# Altium footprint library NDLib.PCBLIB: 499 footprints (part 30 of 32)
Each footprint in its own frame and in the unit in brackets; x right, y up, seen from the top. Pads: shape width x height; smd on the part's side, far side on the other; paste and mask are expansions set on the pad; w line width, h text height; cw(c..) or ccw(c..) is an arc to the next point about the centre after c.
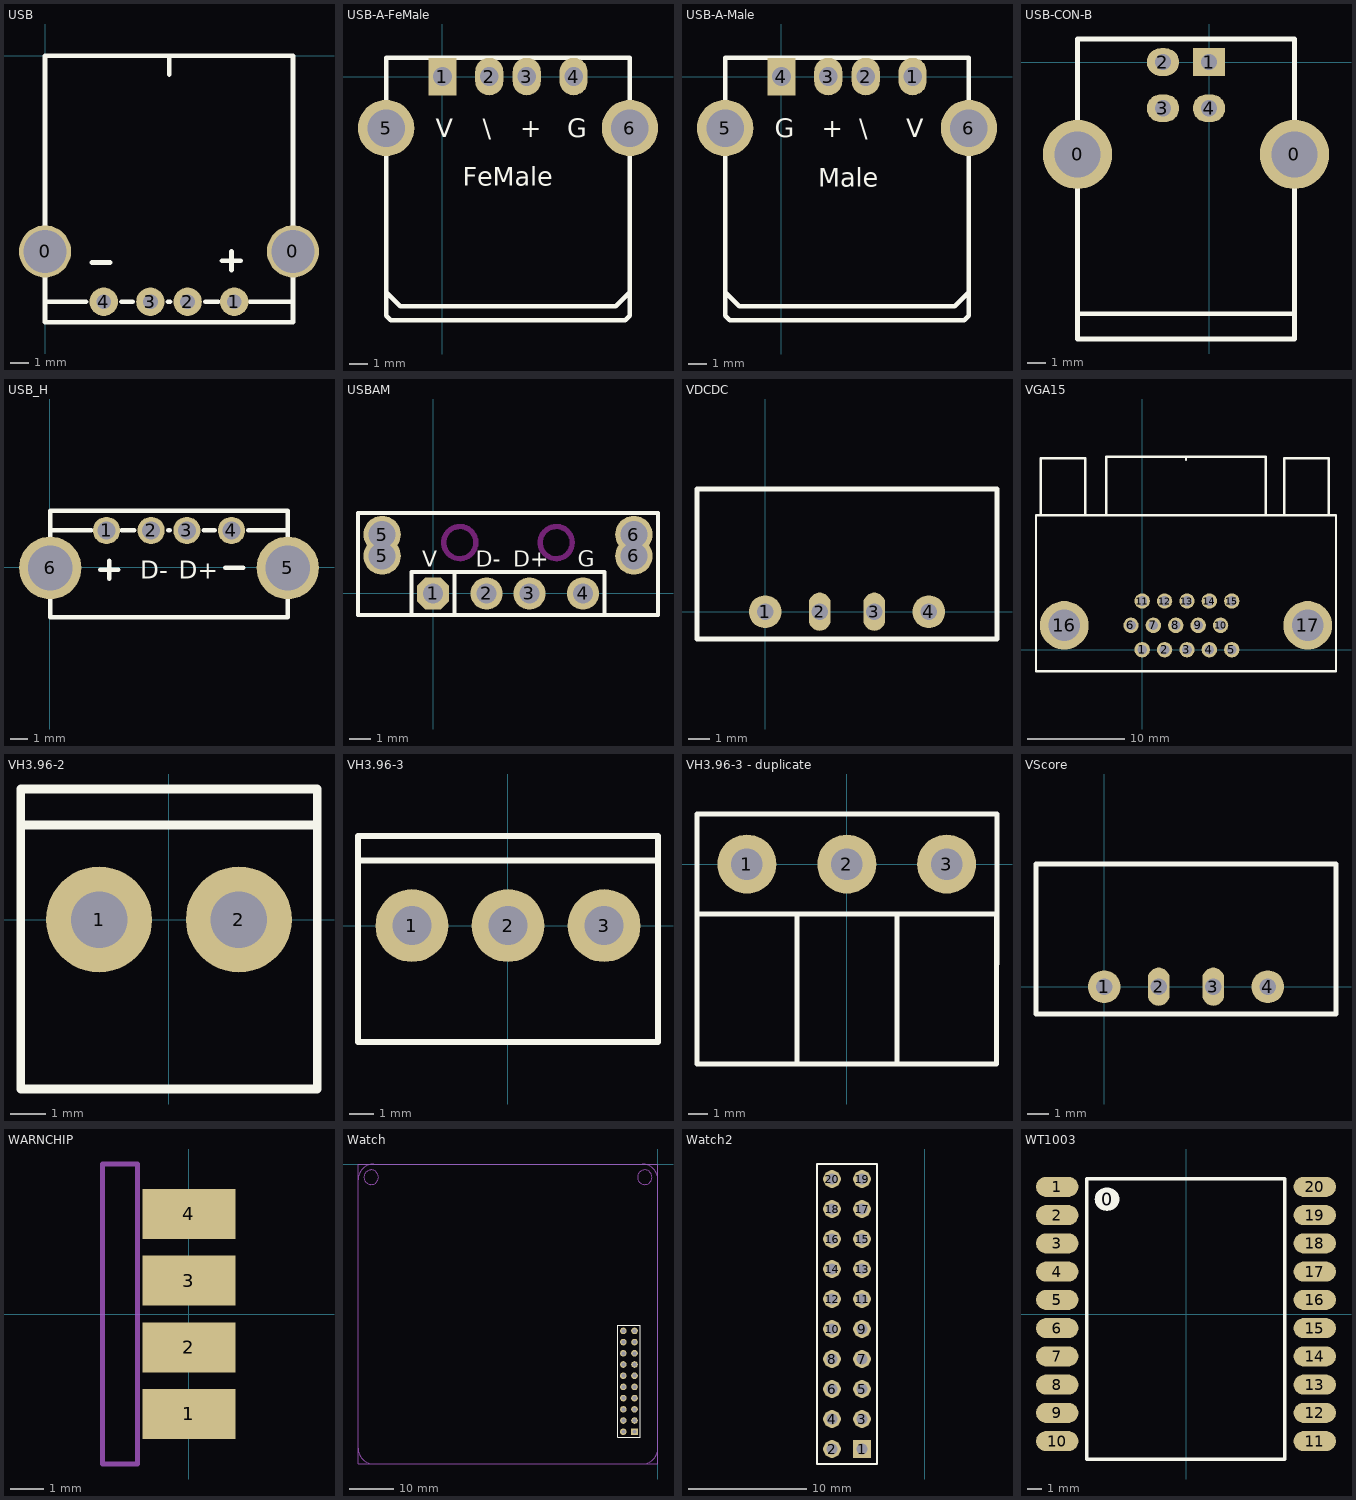
[diagram p29: the footprints below, top view; thin cyan lines are the x and y axes]

## USB [mm]
pads (6):
  round 2.8 hole 2.3: 0(0,-10.5) 0(13.3,-10.5)
  round 1.524 hole 0.8: 1(10.15,-13.2) 2(7.65,-13.2) 3(5.65,-13.2) 4(3.15,-13.2)
TopOverlay:
  lines w0.254: 0,-13.2 2.2,-13.2 ; 2.5,-11.1 3.5,-11.1 ; 4.1,-13.2 4.7,-13.2 ; 6.6,-13.2 6.7,-13.2 ; 6.66,-1 6.66,0 ; 8.6,-13.2 9.3,-13.2 ; 9.5,-11 10.5,-11 ; 10,-11.5 10,-10.5 ; 11,-13.2 13.3,-13.2 ; 0,-14.3 0,0 13.3,0 13.3,-14.3 0,-14.3
3D body: height 7.55, standoff -3.3, extent -1.245,-14.3 14.555,-0.14

## USB-A-FeMale [mil]
height 393.7
pads (6):
  rect 60x80 hole 40: 1(0,0)
  oval 60x80 hole 40: 2(100,0) 3(180,0) 4(280,0)
  round 120 hole 80: 5(-120,-110) 6(400,-110)
TopOverlay:
  lines w10: -120,-460 -90,-490 370,-490 400,-460 ; -120,-510 -120,40 400,40 400,-510 390,-520 -110,-520 -120,-510
  text "G" at 266.22,-129.92 h40
  text "+" at 166.22,-129.92 h40
  text "\" at 86.22,-129.92 h40
  text "V" at -13.78,-129.92 h40
  text "FeMale" at 43.31,-233.27 h40

## USB-A-Male [mil]
height 393.7
pads (6):
  oval 60x80 hole 40: 1(280,0) 2(180,0) 3(100,0)
  rect 60x80 hole 40: 4(0,0)
  round 120 hole 80: 5(-120,-110) 6(400,-110)
TopOverlay:
  lines w10: -120,-460 -90,-490 370,-490 400,-460 ; -120,-510 -110,-520 390,-520 400,-510 400,40 -120,40 -120,-510
  text "Male" at 78.74,-235.24 h40
  text "G" at -13.78,-129.92 h40
  text "+" at 86.22,-129.92 h40
  text "\" at 166.22,-129.92 h40
  text "V" at 266.22,-129.92 h40

## USB-CON-B [mil]
pads (6):
  round 150 hole 100: 0(-285,-200) 0(185,-200)
  rect 70x60 hole 35: 1(0,0)
  oval 70x60 hole 35: 2(-100,0) 3(-100,-100) 4(0,-100)
TopOverlay:
  lines w10: -285,-545 185,-545 ; -285,-230 -285,-600 185,-600 185,-225 ; -285,-170 -285,50 185,50 185,-170

## USB_H [mm] "立式USB插座"
height 14
pads (6):
  round 1.524 hole 1: 1(3.185,2.065) 2(5.685,2.065) 3(7.685,2.065) 4(10.185,2.065)
  round 3.5 hole 2.5: 5(13.335,-0.035) 6(0.035,-0.035)
TopOverlay:
  lines w0.254: 0.035,2.065 2.335,2.065 ; 2.835,-0.135 3.835,-0.135 ; 3.335,-0.635 3.335,0.365 ; 4.035,2.065 4.735,2.065 ; 6.635,2.065 6.735,2.065 ; 8.635,2.065 9.235,2.065 ; 9.835,-0.035 10.835,-0.035 ; 11.135,2.065 13.335,2.065 ; 0.035,-2.794 13.335,-2.794 13.335,3.165 0.035,3.165 0.035,-2.794
  text "D-" at 5.08,-0.635 h1
  text "D+" at 7.239,-0.635 h1

## USBAM [mil]
pads (8):
  oct 60x60 hole 38: 1(0,0)
  round 60 hole 38: 2(100,0) 3(180,0) 4(280,0)
  round 70 hole 50: 5(-95,70) 5(-95,110) 6(375,70) 6(375,110)
TopOverlay:
  lines w8: -40,-40 -40,40 320,40 320,-40 ; 40,-40 40,40 ; -140,-40 -140,150 420,150 420,-40 -140,-40
  text "D-" at 80,50 h30
  text "D+" at 150,50 h30
  text "V" at -20,50 h30
  text "G" at 270,50 h30
KeepOutLayer:
  circle w10: c50,95 r30
  circle w10: c230,95 r30

## VDCDC [mil] "VScore"
height 196.85
pads (4):
  round 60 hole 30: 1(0,0) 4(300,0)
  oval 40x70 hole 30: 2(100,0) 3(200,0)
TopOverlay:
  lines w10: -125,-50 -125,225 425,225 425,-50 -125,-50

## VGA15 [mm]
pads (17):
  round 1.58 hole 1: 1(0,0) 2(2.3,0) 3(4.6,0) 4(6.9,0) 5(9.2,0) 6(-1.15,2.5) 7(1.15,2.5) 8(3.45,2.5) 9(5.75,2.5) 10(8.05,2.5) 11(0,5) 12(2.3,5) 13(4.6,5) 14(6.9,5) 15(9.2,5)
  round 5 hole 3.25: 16(-8,2.5) 17(17,2.5)
TopOverlay:
  lines w0.254: -10.9,-2.2 -10.9,13.8 19.9,13.8 19.9,-2.2 -10.89,-2.2 -10.9,-2.19 ; -10.4,13.8 -10.4,19.67 -5.83,19.67 -5.83,13.82 ; -3.7,13.8 -3.7,19.8 12.7,19.8 12.7,13.8 ; 4.5,19.5 4.5,19.8 ; 14.6,13.8 14.6,19.68 19.18,19.68 19.18,13.84
3D body: height 12.77, standoff -3.27, extent -11.055,-0.875 19.755,20.225

## VH3.96-2 [mm]
pads (2):
  round 3 hole 1.6: 1(-1.98,0) 2(1.98,0)
TopOverlay:
  lines w0.254: -4.2,2.684 4.2,2.684 ; 4.2,-4.8 -4.2,-4.8 -4.2,3.7 4.2,3.7 ; 4.2,-4.8 4.2,3.7 ; 4.2,-4.8 4.2,3.7
3D body: height 3, standoff 0, extent -4.327,-4.927 8.287,3.827
3D body: height 10, standoff 0, extent -4.199,2.685 8.159,3.699
3D body: height 11, standoff 0, extent 5.371,-0.569 6.51,0.57
3D body: height 11, standoff 0, extent 1.411,-0.569 2.55,0.57
3D body: height 11, standoff 0, extent -2.549,-0.569 -1.41,0.57

## VH3.96-3 [mm]
pads (3):
  round 3 hole 1.6: 1(-3.96,0) 2(0,0) 3(3.96,0)
TopOverlay:
  lines w0.254: -6.18,2.684 6.18,2.684 ; -6.18,-4.8 -6.18,3.7 6.18,3.7 6.18,-4.8 -6.18,-4.8
3D body: height 3, standoff 0, extent -6.307,-4.927 6.307,3.827
3D body: height 10, standoff 0, extent -6.179,2.685 6.179,3.699
3D body: height 11, standoff 0, extent 3.391,-0.569 4.53,0.57
3D body: height 11, standoff 0, extent -0.569,-0.569 0.57,0.57
3D body: height 11, standoff 0, extent -4.529,-0.569 -3.39,0.57

## VH3.96-3 - duplicate [mm]
pads (3):
  round 3 hole 1.6: 1(-5.08,0) 2(0,0) 3(5.08,0)
TopOverlay:
  lines w0.254: -2.54,-10.16 -2.54,-2.54 ; 2.54,-10.16 2.54,-2.54 ; 7.638,-5.08 7.638,2.54 -7.62,2.54 -7.62,-10.16 ; -7.62,-10.16 7.62,-10.16 ; -7.62,-10.16 -7.62,-2.54 7.62,-2.54 ; 7.62,-10.16 7.62,-2.54 ; 7.62,-10.16 7.62,-2.54

## VScore [mil] "VScore"
height 196.85
pads (4):
  round 60 hole 30: 1(0,0) 4(300,0)
  oval 40x70 hole 30: 2(100,0) 3(200,0)
TopOverlay:
  lines w10: -125,-50 425,-50 425,225 -125,225 -125,-50

## WARNCHIP [mm]
pads (4):
  rect 2.8x1.5 smd: 1(0,-3) 2(0,-1) 3(0,1) 4(0,3)
Mechanical1:
  lines w0.152: -2.6,-4.5 -2.6,4.5 -1.54,4.5 -1.54,-4.5 -2.6,-4.5

## Watch [mm]
pads (20):
  rect 1.5x1.5 hole 0.9: 1(-5.319,-60.689)
  round 1.5 hole 0.9: 2(-7.859,-60.689) 3(-5.319,-58.149) 4(-7.859,-58.149) 5(-5.319,-55.609) 6(-7.859,-55.609) 7(-5.319,-53.069) 8(-7.859,-53.069) 9(-5.319,-50.529) 10(-7.859,-50.529) 11(-5.319,-47.989) 12(-7.859,-47.989) 13(-5.319,-45.449) 14(-7.859,-45.449) 15(-5.319,-42.909) 16(-7.859,-42.909) 17(-5.319,-40.369) 18(-7.859,-40.369) 19(-5.319,-37.829) 20(-7.859,-37.829)
TopOverlay:
  lines w0.2: -9.129,-61.959 -4.049,-61.959 -4.049,-60.054 -4.049,-36.559 -9.129,-36.559 -9.129,-60.054 -9.129,-61.959
Mechanical1:
  circle w0.254: c-65,-3 r1.65
  circle w0.254: c-3,-3 r1.65
  lines w0.127: -67.955,-64.46 ccw(c-64.455,-64.46) -64.455,-67.96 ; -67.955,-3.54 cw(c-64.455,-3.54) -64.455,-0.04 ; -3.545,-67.96 ccw(c-3.545,-64.46) -0.045,-64.46 ; -3.545,-0.04 cw(c-3.545,-3.54) -0.045,-3.54
  lines w0.254: -68,-68 -68,0 0,0 0,-68 -68,-68

## Watch2 [mm]
pads (20):
  rect 1.5x1.5 hole 0.9: 1(-5.319,-60.689)
  round 1.5 hole 0.9: 2(-7.859,-60.689) 3(-5.319,-58.149) 4(-7.859,-58.149) 5(-5.319,-55.609) 6(-7.859,-55.609) 7(-5.319,-53.069) 8(-7.859,-53.069) 9(-5.319,-50.529) 10(-7.859,-50.529) 11(-5.319,-47.989) 12(-7.859,-47.989) 13(-5.319,-45.449) 14(-7.859,-45.449) 15(-5.319,-42.909) 16(-7.859,-42.909) 17(-5.319,-40.369) 18(-7.859,-40.369) 19(-5.319,-37.829) 20(-7.859,-37.829)
TopOverlay:
  lines w0.2: -9.129,-61.959 -4.049,-61.959 -4.049,-60.054 -4.049,-36.559 -9.129,-36.559 -9.129,-60.054 -9.129,-61.959

## WT1003 [mm]
pads (21):
  oval 1.75x1.65 on Top Overlay: 0(-5.588,8.128)
  oval 3x1.42 smd: 1(-9.115,9) 2(-9.115,7) 3(-9.115,5) 4(-9.115,3) 5(-9.115,1) 6(-9.115,-1) 7(-9.115,-3) 8(-9.115,-5) 9(-9.115,-7) 10(-9.115,-9) 11(9.115,-9) 12(9.115,-7) 13(9.115,-5) 14(9.115,-3) 15(9.115,-1) 16(9.115,1) 17(9.115,3) 18(9.115,5) 19(9.115,7) 20(9.115,9)
TopOverlay:
  lines w0.254: -7.01,-10.269 -7.01,9.568 6.985,9.568 6.985,7.118 6.985,-10.269 -7.01,-10.269